# Altium footprint library Connectors.PcbLib: 72 footprints (part 4 of 5)
Each footprint in its own frame and in the unit in brackets; x right, y up, seen from the top. Pads: shape width x height; smd on the part's side, far side on the other; paste and mask are expansions set on the pad; w line width, h text height; cw(c..) or ccw(c..) is an arc to the next point about the centre after c.
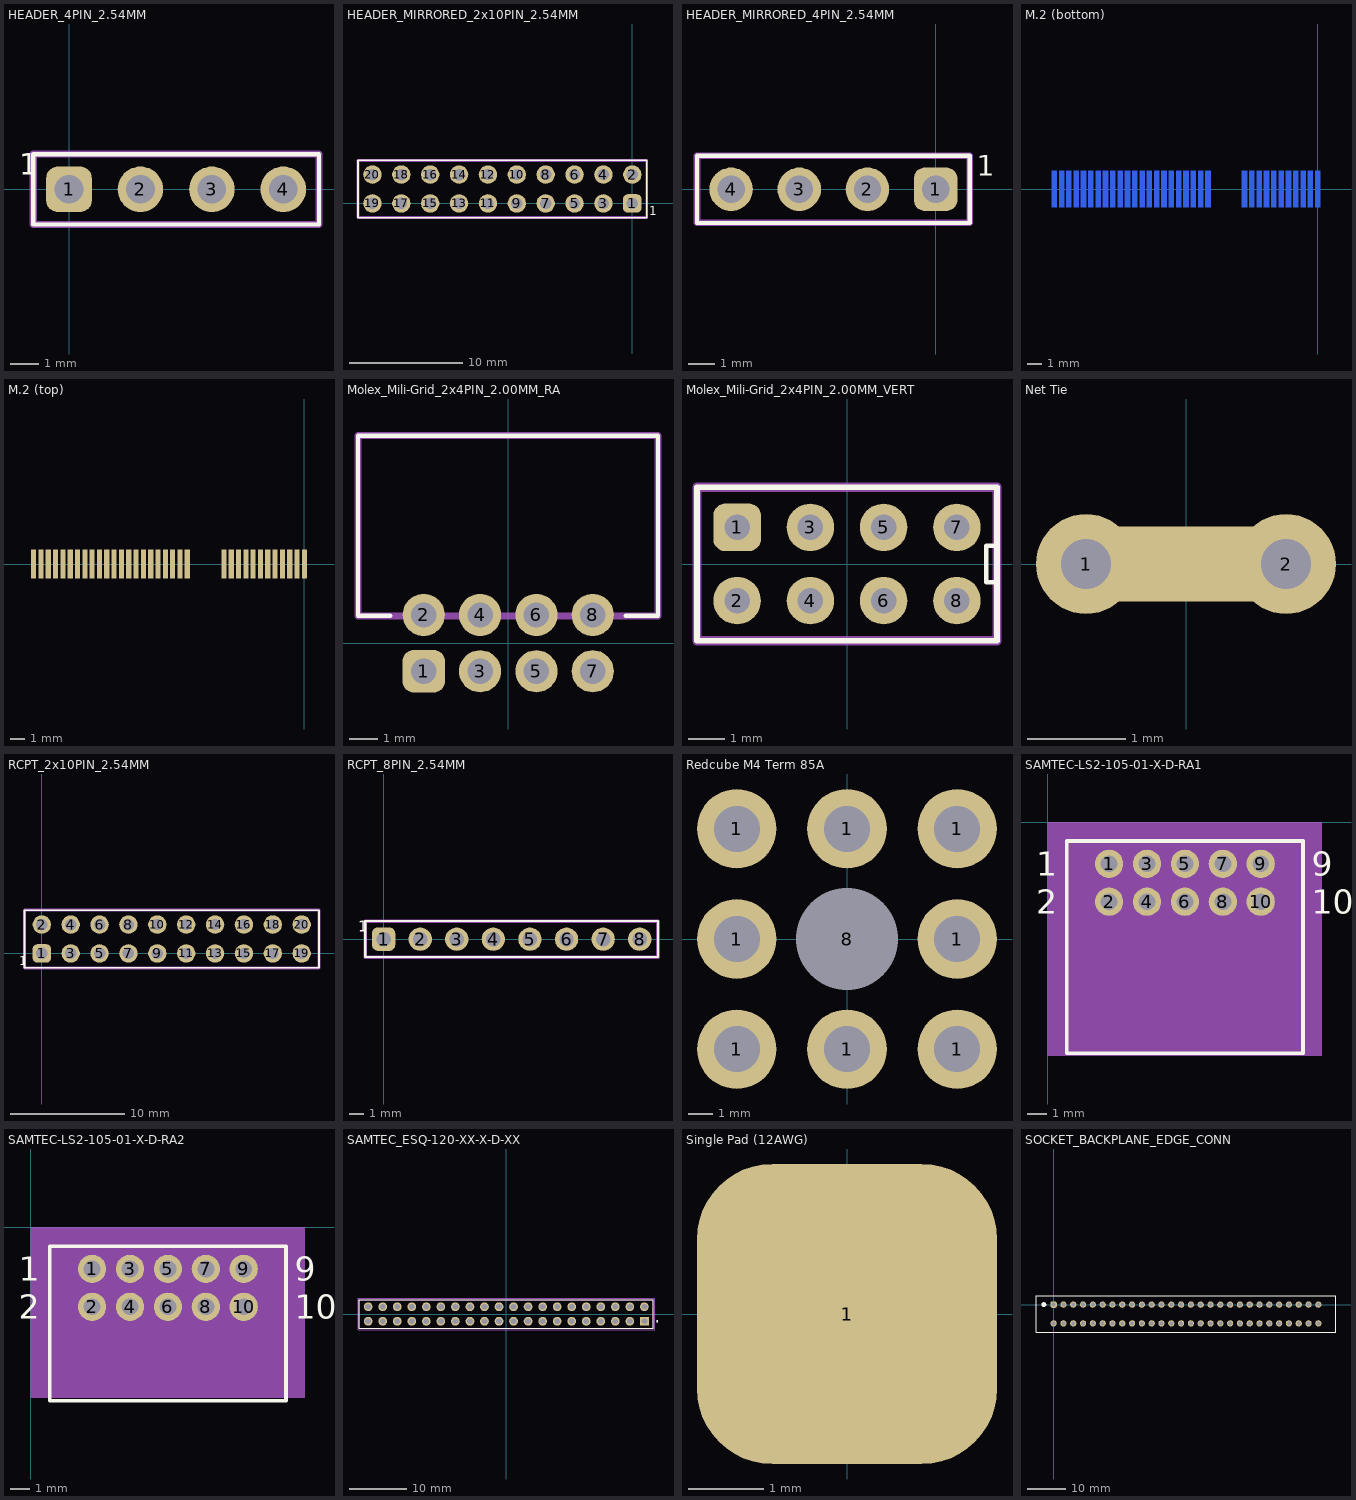
[diagram p3: the footprints below, top view; thin cyan lines are the x and y axes]

## HEADER_4PIN_2.54MM [mm]
pads (4):
  rrect50% 1.62x1.62 hole 1.02: 1(0,0)
  round 1.62 hole 1.02: 2(2.54,0) 3(5.08,0) 4(7.62,0)
Top Overlay:
  lines w0.152: -1.27,-1.25 -1.27,1.25 8.89,1.25 8.89,-1.25 -1.27,-1.25
  text "1" at -1.778,0.508 h0.76
Mechanical 1:
  lines w0.254: -1.27,-1.25 -1.27,1.25 8.89,1.25 8.89,-1.25 -1.27,-1.25
3D body "PEC04SFAN.STEP": height 10.48, standoff -3.19, extent -1.27,-1.27 8.89,1.27

## HEADER_MIRRORED_2x10PIN_2.54MM [mm]
pads (20):
  rrect50% 1.62x1.62 hole 1: 1(0,0)
  round 1.62 hole 1: 2(0,2.54) 3(-2.54,0) 4(-2.54,2.54) 5(-5.08,0) 6(-5.08,2.54) 7(-7.62,0) 8(-7.62,2.54) 9(-10.16,0) 10(-10.16,2.54) 11(-12.7,0) 12(-12.7,2.54)
  round 1.62 hole 1.02: 13(-15.24,0) 14(-15.24,2.54) 15(-17.78,0) 16(-17.78,2.54) 17(-20.32,0) 18(-20.32,2.54) 19(-22.86,0) 20(-22.86,2.54)
Top Overlay:
  lines w0.152: -24.13,-1.25 1.27,-1.25 1.27,3.79 -24.13,3.79 -24.13,-1.25
  text "1" at 1.499,-1.041 h0.76
Mechanical 1:
  lines w0.254: -24.13,-1.25 1.27,-1.25 1.27,3.79 -24.13,3.79 -24.13,-1.25
3D body "XG8T-2031.STEP": height 7.01, standoff -2.99, extent -24.13,-1.25 1.27,3.75

## HEADER_MIRRORED_4PIN_2.54MM [mm]
pads (4):
  rrect50% 1.62x1.62 hole 1.02: 1(0,0)
  round 1.62 hole 1.02: 2(-2.54,0) 3(-5.08,0) 4(-7.62,0)
Top Overlay:
  lines w0.152: -8.89,-1.25 1.27,-1.25 1.27,1.25 -8.89,1.25 -8.89,-1.25
  text "1" at 1.524,0.508 h0.76
Mechanical 1:
  lines w0.254: -8.89,-1.25 1.27,-1.25 1.27,1.25 -8.89,1.25 -8.89,-1.25
3D body "PEC04SFAN.STEP": height 10.48, standoff -3.19, extent -8.89,-1.27 1.27,1.27

## M.2 (bottom) [mm]
pads (33):
  rect 0.35x2.5 smd far side: 2(0,0) 4(-0.5,0) 6(-1,0) 8(-1.5,0) 10(-2.001,0) 12(-2.501,0) 14(-3.001,0) 16(-3.501,0) 18(-4.001,0) 20(-4.501,0) 22(-5.001,0) 32(-7.501,0) 34(-8.002,0) 36(-8.502,0) 38(-9.002,0) 40(-9.502,0) 42(-10.002,0) 44(-10.502,0) 46(-11.002,0) 48(-11.502,0) 50(-12.003,0) 52(-12.503,0) 54(-13.003,0) 56(-13.503,0) 58(-14.003,0) 60(-14.503,0) 62(-15.003,0) 64(-15.503,0) 66(-16.004,0) 68(-16.504,0) 70(-17.004,0) 72(-17.504,0) 74(-18.004,0)

## M.2 (top) [mm] "M.2 E-Key Fingers on the top side"
pads (34):
  rect 0.35x2 smd: 1(0,0) 3(-0.5,0) 5(-1,0) 7(-1.5,0) 9(-2,0) 11(-2.5,0) 13(-3,0) 15(-3.5,0) 17(-4,0) 19(-4.5,0) 21(-5,0) 23(-5.5,0) 33(-8,0) 35(-8.5,0) 37(-9,0) 39(-9.5,0) 41(-10,0) 43(-10.5,0) 45(-11,0) 47(-11.5,0) 49(-12,0) 51(-12.5,0) 53(-13,0) 55(-13.5,0) 57(-14,0) 59(-14.5,0) 61(-15,0) 63(-15.5,0) 65(-16,0) 67(-16.5,0) 69(-17,0) 71(-17.5,0) 73(-18,0) 75(-18.5,0)

## Molex_Mili-Grid_2x4PIN_2.00MM_RA [mm] "Molex Mili-Grid 2.00mm 2x4 RA"
pads (8):
  rrect50% 1.5x1.5 hole 0.9: 1(-3,-1)
  round 1.5 hole 0.9: 2(-3,1) 3(-1,-1) 4(-1,1) 5(1,-1) 6(1,1) 7(3,-1) 8(3,1)
Top Overlay:
  lines w0.152: -4.186,0.966 -5.334,0.966 -5.334,7.366 5.316,7.366 5.316,0.966 4.168,0.966
Mechanical 1:
  lines w0.254: -5.334,0.966 5.316,0.966 5.316,7.366 -5.334,7.366 -5.334,0.966
3D body "MiliGrid2x4RA.stp": height 6.31, standoff -2.15, extent -5.325,-1.27 5.325,7.38

## Molex_Mili-Grid_2x4PIN_2.00MM_VERT [mm] "Molex Mili-Grid 2.00mm 2x4 Vert"
pads (8):
  rrect50% 1.3x1.3 hole 0.7: 1(-3,1)
  round 1.3 hole 0.7: 2(-3,-1) 3(-1,1) 4(-1,-1) 5(1,1) 6(1,-1) 7(3,1) 8(3,-1)
Top Overlay:
  lines w0.127: 4.056,-0.5 3.8,-0.5 3.8,0.5 4.056,0.5
  lines w0.152: -4.095,-2.095 4.095,-2.095 4.095,2.095 -4.095,2.095 -4.095,-2.095
Mechanical 1:
  lines w0.254: -4.095,-2.095 4.095,-2.095 4.095,2.095 -4.095,2.095 -4.095,-2.095
3D body "MiliGrid2x4VERT.stp": height 4.45, standoff -2.99, extent -4.047,-2.079 4.143,2.111

## Net Tie [mil]
pads (3):
  round 40 hole 20: 1(-40,0) 2(40,0)
  rrect50% 80x30 smd: ""(0,0)

## RCPT_2x10PIN_2.54MM [mm]
pads (20):
  rrect50% 1.62x1.62 hole 1.02: 1(0,0)
  round 1.62 hole 1.02: 2(0,2.54) 3(2.54,0) 4(2.54,2.54) 5(5.08,0) 6(5.08,2.54) 7(7.62,0) 8(7.62,2.54)
  round 1.62 hole 1: 9(10.16,0) 10(10.16,2.54) 11(12.7,0) 12(12.7,2.54) 13(15.24,0) 14(15.24,2.54) 15(17.78,0) 16(17.78,2.54) 17(20.32,0) 18(20.32,2.54) 19(22.86,0) 20(22.86,2.54)
Top Overlay:
  lines w0.152: -1.524,-1.27 24.384,-1.27 24.384,3.81 -1.524,3.81 -1.524,-1.27
  text "1" at -2.007,-1.041 h0.76
Mechanical 1:
  lines w0.254: -1.524,-1.27 24.384,-1.27 24.384,3.81 -1.524,3.81 -1.524,-1.27
3D body "PPPC102LFBN-RC--3DModel-STEP-56544.STEP": height 8.51, standoff -3.4, extent -1.524,-1.27 24.384,3.81

## RCPT_8PIN_2.54MM [mm]
pads (8):
  rrect50% 1.62x1.62 hole 1.02: 1(0,0)
  round 1.62 hole 1.02: 2(2.54,0) 3(5.08,0) 4(7.62,0)
  round 1.62 hole 1: 5(10.16,0) 6(12.7,0) 7(15.24,0) 8(17.78,0)
Top Overlay:
  lines w0.152: -1.27,-1.25 -1.27,1.25 19.05,1.25 19.05,-1.25 -1.27,-1.25
  text "1" at -1.778,0.508 h0.76
Mechanical 1:
  lines w0.254: -1.27,-1.25 -1.27,1.25 19.05,1.25 19.05,-1.25 -1.27,-1.25
3D body "c-534237-6-s-3d.stp": height 8.65, standoff -2.91, extent -1.27,-1.778 19.05,1.778

## Redcube M4 Term 85A [mm]
pads (9):
  round 3.2 hole 1.85: 1(-4.435,-4.435) 1(-4.435,0) 1(-4.435,4.435) 1(0,-4.435) 1(0,4.435) 1(4.435,-4.435) 1(4.435,0) 1(4.435,4.435)
  round 3.2 hole 4.1 unplated: 8(0,0)
3D body "74650094 (rev1).stp": height 3, standoff -3, extent -5,-5 5,5

## SAMTEC-LS2-105-01-X-D-RA1 [mm]
pads (10):
  round 1.49 hole 0.89 mask+0: 1(3.229,-2.193) 2(3.229,-4.193) 3(5.229,-2.193) 4(5.229,-4.193) 5(7.229,-2.193) 6(7.229,-4.193) 7(9.229,-2.193) 8(9.229,-4.193) 9(11.229,-2.193) 10(11.229,-4.193)
Top Overlay:
  lines w0.2: 0.997,-12.192 13.461,-12.192 13.461,-0.997 0.997,-0.997 0.997,-12.192
  text "10" at 13.929,-4.828 h1.27
  text "9" at 13.929,-2.828 h1.27
  text "2" at -0.627,-4.828 h1.27
  text "1" at -0.627,-2.828 h1.27
Top Solder:
  circle w0: c11.229,-4.193 r0.796
  circle w0: c11.229,-2.193 r0.796
  circle w0: c9.229,-4.193 r0.796
  circle w0: c9.229,-2.193 r0.796
  circle w0: c7.229,-4.193 r0.796
  circle w0: c7.229,-2.193 r0.796
  circle w0: c5.229,-4.193 r0.796
  circle w0: c5.229,-2.193 r0.796
  circle w0: c3.229,-4.193 r0.796
  circle w0: c3.229,-2.193 r0.796
Bottom Solder:
  circle w0: c11.229,-4.193 r0.796
  circle w0: c11.229,-2.193 r0.796
  circle w0: c9.229,-4.193 r0.796
  circle w0: c9.229,-2.193 r0.796
  circle w0: c7.229,-4.193 r0.796
  circle w0: c7.229,-2.193 r0.796
  circle w0: c5.229,-4.193 r0.796
  circle w0: c5.229,-2.193 r0.796
  circle w0: c3.229,-4.193 r0.796
  circle w0: c3.229,-2.193 r0.796
Mechanical 15:
  region: 14.458,-12.321 0,-12.321 0,0 14.458,0
3D body "LS2-105-01-L-D-RA1.stp": height 5.34, standoff -2.22, extent 1.584,-12.192 13.148,-1.815

## SAMTEC-LS2-105-01-X-D-RA2 [mm]
pads (10):
  round 1.49 hole 0.89 mask+0: 1(3.239,-2.191) 2(3.239,-4.191) 3(5.239,-2.191) 4(5.239,-4.191) 5(7.239,-2.191) 6(7.239,-4.191) 7(9.239,-2.191) 8(9.239,-4.191) 9(11.239,-2.191) 10(11.239,-4.191)
Top Overlay:
  lines w0.2: 1.007,-9.144 13.471,-9.144 13.471,-0.995 1.007,-0.995 1.007,-9.144
  text "10" at 13.939,-4.826 h1.27
  text "9" at 13.939,-2.826 h1.27
  text "2" at -0.617,-4.826 h1.27
  text "1" at -0.617,-2.826 h1.27
Top Solder:
  circle w0: c11.239,-4.191 r0.796
  circle w0: c11.239,-2.191 r0.796
  circle w0: c9.239,-4.191 r0.796
  circle w0: c9.239,-2.191 r0.796
  circle w0: c7.239,-4.191 r0.796
  circle w0: c7.239,-2.191 r0.796
  circle w0: c5.239,-4.191 r0.796
  circle w0: c5.239,-2.191 r0.796
  circle w0: c3.239,-4.191 r0.796
  circle w0: c3.239,-2.191 r0.796
Bottom Solder:
  circle w0: c11.239,-4.191 r0.796
  circle w0: c11.239,-2.191 r0.796
  circle w0: c9.239,-4.191 r0.796
  circle w0: c9.239,-2.191 r0.796
  circle w0: c7.239,-4.191 r0.796
  circle w0: c7.239,-2.191 r0.796
  circle w0: c5.239,-4.191 r0.796
  circle w0: c5.239,-2.191 r0.796
  circle w0: c3.239,-4.191 r0.796
  circle w0: c3.239,-2.191 r0.796
Mechanical 1:
  lines w0.1: 7.239,-4.191 9.239,-4.191
Mechanical 15:
  region: 14.468,-8.997 0.01,-8.997 0,0 14.468,0.002
3D body "LS2-105-01-L-D-RA2.stp": height 5.29, standoff -2.27, extent 1.524,-12.409 13.089,-2.032
3D body: height 4.92, standoff -2.64, extent 8.202,-4.257 9.239,-4.191

## SAMTEC_ESQ-120-XX-X-D-XX [mm]
height 13.84
pads (40):
  rect 1.53x1.53 / inner round 1.53 / far side rect 1.53x1.53 hole 1.02: 01(24.13,-1.27)
  round 1.53 hole 1.02: 02(24.13,1.27) 03(21.59,-1.27) 04(21.59,1.27) 05(19.05,-1.27) 06(19.05,1.27) 07(16.51,-1.27) 08(16.51,1.27) 09(13.97,-1.27) 10(13.97,1.27) 11(11.43,-1.27) 12(11.43,1.27) 13(8.89,-1.27) 14(8.89,1.27) 15(6.35,-1.27) 16(6.35,1.27) 17(3.81,-1.27) 18(3.81,1.27) 19(1.27,-1.27) 20(1.27,1.27) 21(-1.27,-1.27) 22(-1.27,1.27) 23(-3.81,-1.27) 24(-3.81,1.27) 25(-6.35,-1.27) 26(-6.35,1.27) 27(-8.89,-1.27) 28(-8.89,1.27) 29(-11.43,-1.27) 30(-11.43,1.27) 31(-13.97,-1.27) 32(-13.97,1.27) 33(-16.51,-1.27) 34(-16.51,1.27) 35(-19.05,-1.27) 36(-19.05,1.27) 37(-21.59,-1.27) 38(-21.59,1.27) 39(-24.13,-1.27) 40(-24.13,1.27)
Top Overlay:
  circle w0.2: c26.405,-1.27 r0.1
  lines w0.2: -25.655,-2.475 -25.655,2.475 25.655,2.475 25.655,-2.475 -25.655,-2.475
Mechanical 13:
  circle w0.2: c26.405,-1.27 r0.1
  lines w0.1: -25.655,-2.475 -25.655,2.475 25.655,2.475 25.655,-2.475 -25.655,-2.475
Mechanical 15:
  lines w0.05: -25.905,-2.725 25.905,-2.725 25.905,2.725 -25.905,2.725 -25.905,-2.725
3D body "ESQ-120-33-T-D.stp": height 16.14, standoff -2.27, extent -25.654,-2.54 25.654,2.54

## Single Pad (12AWG) [mm] "DO NOT USE"
pads (1):
  rrect50% 4x4 smd: 1(0,0)

## SOCKET_BACKPLANE_EDGE_CONN [mm]
pads (56):
  rrect50% 1.62x1.62 hole 1.02: 1(0,0)
  round 1.62 hole 1.02: 2(2.54,0) 3(5.08,0) 4(7.62,0) 5(10.16,0) 6(12.7,0) 7(15.24,0) 8(17.78,0) 9(20.32,0) 10(22.86,0) 11(25.4,0) 12(27.94,0) 13(30.48,0) 14(33.02,0) 15(35.56,0) 16(38.1,0) 17(40.64,0) 18(43.18,0) 19(45.72,0) 20(48.26,0) 21(50.8,0) 22(53.34,0) 23(55.88,0) 24(58.42,0) 25(60.96,0) 26(63.5,0) 27(66.04,0) 28(68.58,0) 29(68.58,-4.851) 30(66.04,-4.851) 31(63.5,-4.851) 32(60.96,-4.851) 33(58.42,-4.851) 34(55.88,-4.851) 35(53.34,-4.851) 36(50.8,-4.851) 37(48.26,-4.851) 38(45.72,-4.851) 39(43.18,-4.851) 40(40.64,-4.851) 41(38.1,-4.851) 42(35.56,-4.851) 43(33.02,-4.851) 44(30.48,-4.851) 45(27.94,-4.851) 46(25.4,-4.851) 47(22.86,-4.851) 48(20.32,-4.851) 49(17.78,-4.851) 50(15.24,-4.851) 51(12.7,-4.851) 52(10.16,-4.851) 53(7.62,-4.851) 54(5.08,-4.851) 55(2.54,-4.851) 56(0,-4.851)
Top Overlay:
  circle w0.762: c-2.54,0 r0.254
  lines w0.127: -4.572,-7.099 -4.572,2.248 73.152,2.248 73.152,-7.099 -4.572,-7.099
3D body "c-5530843-6-f-3d.stp": height 15.51, standoff -3.16, extent -4.572,-7.099 73.152,2.248